# Altium footprint library ST封装.PcbLib: 1336 footprints (part 91 of 109) (continued)
## SQFP44X44-424(N) [mm] (continued)
Top Overlay:
  lines w0.2: -0.4,-42.65 -0.4,-44.1 1.05,-44.1 ; -0.4,0.65 -0.4,1.3 0.4,2.1 1.05,2.1 ; 44.35,-44.1 45.8,-44.1 45.8,-42.65 ; 44.35,2.1 45.8,2.1 45.8,0.65

## SQFP44X44-424(T) [mm]
pads (424):
  rect 0.3x1.6 smd: 1(0,0)
  oval 0.3x1.6 smd: 2(-0.4,0) 3(-0.8,0) 4(-1.2,0) 5(-1.6,0) 6(-2,0) 7(-2.4,0) 8(-2.8,0) 9(-3.2,0) 10(-3.6,0) 11(-4,0) 12(-4.4,0) 13(-4.8,0) 14(-5.2,0) 15(-5.6,0) 16(-6,0) 17(-6.4,0) 18(-6.8,0) 19(-7.2,0) 20(-7.6,0) 21(-8,0) 22(-8.4,0) 23(-8.8,0) 24(-9.2,0) 25(-9.6,0) 26(-10,0) 27(-10.4,0) 28(-10.8,0) 29(-11.2,0) 30(-11.6,0) 31(-12,0) 32(-12.4,0) 33(-12.8,0) 34(-13.2,0) 35(-13.6,0) 36(-14,0) 37(-14.4,0) 38(-14.8,0) 39(-15.2,0) 40(-15.6,0) 41(-16,0) 42(-16.4,0) 43(-16.8,0) 44(-17.2,0) 45(-17.6,0) 46(-18,0) 47(-18.4,0) 48(-18.8,0) 49(-19.2,0) 50(-19.6,0) 51(-20,0) 52(-20.4,0) 53(-20.8,0) 160(-20.8,-45.4) 161(-20.4,-45.4) 162(-20,-45.4) 163(-19.6,-45.4) 164(-19.2,-45.4) 165(-18.8,-45.4) 166(-18.4,-45.4) 167(-18,-45.4) 168(-17.6,-45.4) 169(-17.2,-45.4) 170(-16.8,-45.4) 171(-16.4,-45.4) 172(-16,-45.4) 173(-15.6,-45.4) 174(-15.2,-45.4) 175(-14.8,-45.4) 176(-14.4,-45.4) 177(-14,-45.4) 178(-13.6,-45.4) 179(-13.2,-45.4) 180(-12.8,-45.4) 181(-12.4,-45.4) 182(-12,-45.4) 183(-11.6,-45.4) 184(-11.2,-45.4) 185(-10.8,-45.4) 186(-10.4,-45.4) 187(-10,-45.4) 188(-9.6,-45.4) 189(-9.2,-45.4) 190(-8.8,-45.4) 191(-8.4,-45.4) 192(-8,-45.4) 193(-7.6,-45.4) 194(-7.2,-45.4) 195(-6.8,-45.4) 196(-6.4,-45.4) 197(-6,-45.4) 198(-5.6,-45.4) 199(-5.2,-45.4) 200(-4.8,-45.4) 201(-4.4,-45.4) 202(-4,-45.4) 203(-3.6,-45.4) 204(-3.2,-45.4) 205(-2.8,-45.4) 206(-2.4,-45.4) 207(-2,-45.4) 208(-1.6,-45.4) 209(-1.2,-45.4) 210(-0.8,-45.4) 211(-0.4,-45.4) 212(0,-45.4) 213(0.4,-45.4) 214(0.8,-45.4) 215(1.2,-45.4) 216(1.6,-45.4) 217(2,-45.4) 218(2.4,-45.4) 219(2.8,-45.4) 220(3.2,-45.4) 221(3.6,-45.4) 222(4,-45.4) 223(4.4,-45.4) 224(4.8,-45.4) 225(5.2,-45.4) 226(5.6,-45.4) 227(6,-45.4) 228(6.4,-45.4) 229(6.8,-45.4) 230(7.2,-45.4) 231(7.6,-45.4) 232(8,-45.4) 233(8.4,-45.4) 234(8.8,-45.4) 235(9.2,-45.4) 236(9.6,-45.4) 237(10,-45.4) 238(10.4,-45.4) 239(10.8,-45.4) 240(11.2,-45.4) 241(11.6,-45.4) 242(12,-45.4) 243(12.4,-45.4) 244(12.8,-45.4) 245(13.2,-45.4) 246(13.6,-45.4) 247(14,-45.4) 248(14.4,-45.4) 249(14.8,-45.4) 250(15.2,-45.4) 251(15.6,-45.4) 252(16,-45.4) 253(16.4,-45.4) 254(16.8,-45.4) 255(17.2,-45.4) 256(17.6,-45.4) 257(18,-45.4) 258(18.4,-45.4) 259(18.8,-45.4) 260(19.2,-45.4) 261(19.6,-45.4) 262(20,-45.4) 263(20.4,-45.4) 264(20.8,-45.4) 265(21.2,-45.4) 372(21.2,0) 373(20.8,0) 374(20.4,0) 375(20,0) 376(19.6,0) 377(19.2,0) 378(18.8,0) 379(18.4,0) 380(18,0) 381(17.6,0) 382(17.2,0) 383(16.8,0) 384(16.4,0) 385(16,0) 386(15.6,0) 387(15.2,0) 388(14.8,0) 389(14.4,0) 390(14,0) 391(13.6,0) 392(13.2,0) 393(12.8,0) 394(12.4,0) 395(12,0) 396(11.6,0) 397(11.2,0) 398(10.8,0) 399(10.4,0) 400(10,0) 401(9.6,0) 402(9.2,0) 403(8.8,0) 404(8.4,0) 405(8,0) 406(7.6,0) 407(7.2,0) 408(6.8,0) 409(6.4,0) 410(6,0) 411(5.6,0) 412(5.2,0) 413(4.8,0) 414(4.4,0) 415(4,0) 416(3.6,0) 417(3.2,0) 418(2.8,0) 419(2.4,0) 420(2,0) 421(1.6,0) 422(1.2,0) 423(0.8,0) 424(0.4,0)
  oval 1.6x0.3 smd: 54(-22.5,-1.7) 55(-22.5,-2.1) 56(-22.5,-2.5) 57(-22.5,-2.9) 58(-22.5,-3.3) 59(-22.5,-3.7) 60(-22.5,-4.1) 61(-22.5,-4.5) 62(-22.5,-4.9) 63(-22.5,-5.3) 64(-22.5,-5.7) 65(-22.5,-6.1) 66(-22.5,-6.5) 67(-22.5,-6.9) 68(-22.5,-7.3) 69(-22.5,-7.7) 70(-22.5,-8.1) 71(-22.5,-8.5) 72(-22.5,-8.9) 73(-22.5,-9.3) 74(-22.5,-9.7) 75(-22.5,-10.1) 76(-22.5,-10.5) 77(-22.5,-10.9) 78(-22.5,-11.3) 79(-22.5,-11.7) 80(-22.5,-12.1) 81(-22.5,-12.5) 82(-22.5,-12.9) 83(-22.5,-13.3) 84(-22.5,-13.7) 85(-22.5,-14.1) 86(-22.5,-14.5) 87(-22.5,-14.9) 88(-22.5,-15.3) 89(-22.5,-15.7) 90(-22.5,-16.1) 91(-22.5,-16.5) 92(-22.5,-16.9) 93(-22.5,-17.3) 94(-22.5,-17.7) 95(-22.5,-18.1) 96(-22.5,-18.5) 97(-22.5,-18.9) 98(-22.5,-19.3) 99(-22.5,-19.7) 100(-22.5,-20.1) 101(-22.5,-20.5) 102(-22.5,-20.9) 103(-22.5,-21.3) 104(-22.5,-21.7) 105(-22.5,-22.1) 106(-22.5,-22.5) 107(-22.5,-22.9) 108(-22.5,-23.3) 109(-22.5,-23.7) 110(-22.5,-24.1) 111(-22.5,-24.5) 112(-22.5,-24.9) 113(-22.5,-25.3) 114(-22.5,-25.7) 115(-22.5,-26.1) 116(-22.5,-26.5) 117(-22.5,-26.9) 118(-22.5,-27.3) 119(-22.5,-27.7) 120(-22.5,-28.1) 121(-22.5,-28.5) 122(-22.5,-28.9) 123(-22.5,-29.3) 124(-22.5,-29.7) 125(-22.5,-30.1) 126(-22.5,-30.5) 127(-22.5,-30.9) 128(-22.5,-31.3) 129(-22.5,-31.7) 130(-22.5,-32.1) 131(-22.5,-32.5) 132(-22.5,-32.9) 133(-22.5,-33.3) 134(-22.5,-33.7) 135(-22.5,-34.1) 136(-22.5,-34.5) 137(-22.5,-34.9) 138(-22.5,-35.3) 139(-22.5,-35.7) 140(-22.5,-36.1) 141(-22.5,-36.5) 142(-22.5,-36.9) 143(-22.5,-37.3) 144(-22.5,-37.7) 145(-22.5,-38.1) 146(-22.5,-38.5) 147(-22.5,-38.9) 148(-22.5,-39.3) 149(-22.5,-39.7) 150(-22.5,-40.1) 151(-22.5,-40.5) 152(-22.5,-40.9) 153(-22.5,-41.3) 154(-22.5,-41.7) 155(-22.5,-42.1) 156(-22.5,-42.5) 157(-22.5,-42.9) 158(-22.5,-43.3) 159(-22.5,-43.7) 266(22.9,-43.7) 267(22.9,-43.3) 268(22.9,-42.9) 269(22.9,-42.5) 270(22.9,-42.1) 271(22.9,-41.7) 272(22.9,-41.3) 273(22.9,-40.9) 274(22.9,-40.5) 275(22.9,-40.1) 276(22.9,-39.7) 277(22.9,-39.3) 278(22.9,-38.9) 279(22.9,-38.5) 280(22.9,-38.1) 281(22.9,-37.7) 282(22.9,-37.3) 283(22.9,-36.9) 284(22.9,-36.5) 285(22.9,-36.1) 286(22.9,-35.7) 287(22.9,-35.3) 288(22.9,-34.9) 289(22.9,-34.5) 290(22.9,-34.1) 291(22.9,-33.7) 292(22.9,-33.3) 293(22.9,-32.9) 294(22.9,-32.5) 295(22.9,-32.1) 296(22.9,-31.7) 297(22.9,-31.3) 298(22.9,-30.9) 299(22.9,-30.5) 300(22.9,-30.1) 301(22.9,-29.7) 302(22.9,-29.3) 303(22.9,-28.9) 304(22.9,-28.5) 305(22.9,-28.1) 306(22.9,-27.7) 307(22.9,-27.3) 308(22.9,-26.9) 309(22.9,-26.5) 310(22.9,-26.1) 311(22.9,-25.7) 312(22.9,-25.3) 313(22.9,-24.9) 314(22.9,-24.5) 315(22.9,-24.1) 316(22.9,-23.7) 317(22.9,-23.3) 318(22.9,-22.9) 319(22.9,-22.5) 320(22.9,-22.1) 321(22.9,-21.7) 322(22.9,-21.3) 323(22.9,-20.9) 324(22.9,-20.5) 325(22.9,-20.1) 326(22.9,-19.7) 327(22.9,-19.3) 328(22.9,-18.9) 329(22.9,-18.5) 330(22.9,-18.1) 331(22.9,-17.7) 332(22.9,-17.3) 333(22.9,-16.9) 334(22.9,-16.5) 335(22.9,-16.1) 336(22.9,-15.7) 337(22.9,-15.3) 338(22.9,-14.9) 339(22.9,-14.5) 340(22.9,-14.1) 341(22.9,-13.7) 342(22.9,-13.3) 343(22.9,-12.9) 344(22.9,-12.5) 345(22.9,-12.1) 346(22.9,-11.7) 347(22.9,-11.3) 348(22.9,-10.9) 349(22.9,-10.5) 350(22.9,-10.1) 351(22.9,-9.7) 352(22.9,-9.3) 353(22.9,-8.9) 354(22.9,-8.5) 355(22.9,-8.1) 356(22.9,-7.7) 357(22.9,-7.3) 358(22.9,-6.9) 359(22.9,-6.5) 360(22.9,-6.1) 361(22.9,-5.7) 362(22.9,-5.3) 363(22.9,-4.9) 364(22.9,-4.5) 365(22.9,-4.1) 366(22.9,-3.7) 367(22.9,-3.3) 368(22.9,-2.9) 369(22.9,-2.5) 370(22.9,-2.1) 371(22.9,-1.7)
Top Overlay:
  lines w0.2: -22.9,-44.35 -22.9,-45.8 -21.45,-45.8 ; -22.9,-1.05 -22.9,-0.4 -22.1,0.4 -21.45,0.4 ; 21.85,-45.8 23.3,-45.8 23.3,-44.35 ; 21.85,0.4 23.3,0.4 23.3,-1.05

## SQFP44X44-432(N) [mm]
pads (432):
  rect 1.6x0.3 smd: 1(0,0)
  oval 1.6x0.3 smd: 2(0,-0.4) 3(0,-0.8) 4(0,-1.2) 5(0,-1.6) 6(0,-2) 7(0,-2.4) 8(0,-2.8) 9(0,-3.2) 10(0,-3.6) 11(0,-4) 12(0,-4.4) 13(0,-4.8) 14(0,-5.2) 15(0,-5.6) 16(0,-6) 17(0,-6.4) 18(0,-6.8) 19(0,-7.2) 20(0,-7.6) 21(0,-8) 22(0,-8.4) 23(0,-8.8) 24(0,-9.2) 25(0,-9.6) 26(0,-10) 27(0,-10.4) 28(0,-10.8) 29(0,-11.2) 30(0,-11.6) 31(0,-12) 32(0,-12.4) 33(0,-12.8) 34(0,-13.2) 35(0,-13.6) 36(0,-14) 37(0,-14.4) 38(0,-14.8) 39(0,-15.2) 40(0,-15.6) 41(0,-16) 42(0,-16.4) 43(0,-16.8) 44(0,-17.2) 45(0,-17.6) 46(0,-18) 47(0,-18.4) 48(0,-18.8) 49(0,-19.2) 50(0,-19.6) 51(0,-20) 52(0,-20.4) 53(0,-20.8) 54(0,-21.2) 55(0,-21.6) 56(0,-22) 57(0,-22.4) 58(0,-22.8) 59(0,-23.2) 60(0,-23.6) 61(0,-24) 62(0,-24.4) 63(0,-24.8) 64(0,-25.2) 65(0,-25.6) 66(0,-26) 67(0,-26.4) 68(0,-26.8) 69(0,-27.2) 70(0,-27.6) 71(0,-28) 72(0,-28.4) 73(0,-28.8) 74(0,-29.2) 75(0,-29.6) 76(0,-30) 77(0,-30.4) 78(0,-30.8) 79(0,-31.2) 80(0,-31.6) 81(0,-32) 82(0,-32.4) 83(0,-32.8) 84(0,-33.2) 85(0,-33.6) 86(0,-34) 87(0,-34.4) 88(0,-34.8) 89(0,-35.2) 90(0,-35.6) 91(0,-36) 92(0,-36.4) 93(0,-36.8) 94(0,-37.2) 95(0,-37.6) 96(0,-38) 97(0,-38.4) 98(0,-38.8) 99(0,-39.2) 100(0,-39.6) 101(0,-40) 102(0,-40.4) 103(0,-40.8) 104(0,-41.2) 105(0,-41.6) 106(0,-42) 107(0,-42.4) 108(0,-42.8) 217(45.4,-42.8) 218(45.4,-42.4) 219(45.4,-42) 220(45.4,-41.6) 221(45.4,-41.2) 222(45.4,-40.8) 223(45.4,-40.4) 224(45.4,-40) 225(45.4,-39.6) 226(45.4,-39.2) 227(45.4,-38.8) 228(45.4,-38.4) 229(45.4,-38) 230(45.4,-37.6) 231(45.4,-37.2) 232(45.4,-36.8) 233(45.4,-36.4) 234(45.4,-36) 235(45.4,-35.6) 236(45.4,-35.2) 237(45.4,-34.8) 238(45.4,-34.4) 239(45.4,-34) 240(45.4,-33.6) 241(45.4,-33.2) 242(45.4,-32.8) 243(45.4,-32.4) 244(45.4,-32) 245(45.4,-31.6) 246(45.4,-31.2) 247(45.4,-30.8) 248(45.4,-30.4) 249(45.4,-30) 250(45.4,-29.6) 251(45.4,-29.2) 252(45.4,-28.8) 253(45.4,-28.4) 254(45.4,-28) 255(45.4,-27.6) 256(45.4,-27.2) 257(45.4,-26.8) 258(45.4,-26.4) 259(45.4,-26) 260(45.4,-25.6) 261(45.4,-25.2) 262(45.4,-24.8) 263(45.4,-24.4) 264(45.4,-24) 265(45.4,-23.6) 266(45.4,-23.2) 267(45.4,-22.8) 268(45.4,-22.4) 269(45.4,-22) 270(45.4,-21.6) 271(45.4,-21.2) 272(45.4,-20.8) 273(45.4,-20.4) 274(45.4,-20) 275(45.4,-19.6) 276(45.4,-19.2) 277(45.4,-18.8) 278(45.4,-18.4) 279(45.4,-18) 280(45.4,-17.6) 281(45.4,-17.2) 282(45.4,-16.8) 283(45.4,-16.4) 284(45.4,-16) 285(45.4,-15.6) 286(45.4,-15.2) 287(45.4,-14.8) 288(45.4,-14.4) 289(45.4,-14) 290(45.4,-13.6) 291(45.4,-13.2) 292(45.4,-12.8) 293(45.4,-12.4) 294(45.4,-12) 295(45.4,-11.6) 296(45.4,-11.2) 297(45.4,-10.8) 298(45.4,-10.4) 299(45.4,-10) 300(45.4,-9.6) 301(45.4,-9.2) 302(45.4,-8.8) 303(45.4,-8.4) 304(45.4,-8) 305(45.4,-7.6) 306(45.4,-7.2) 307(45.4,-6.8) 308(45.4,-6.4) 309(45.4,-6) 310(45.4,-5.6) 311(45.4,-5.2) 312(45.4,-4.8) 313(45.4,-4.4) 314(45.4,-4) 315(45.4,-3.6) 316(45.4,-3.2) 317(45.4,-2.8) 318(45.4,-2.4) 319(45.4,-2) 320(45.4,-1.6) 321(45.4,-1.2) 322(45.4,-0.8) 323(45.4,-0.4) 324(45.4,0)
  oval 0.3x1.6 smd: 109(1.3,-44.1) 110(1.7,-44.1) 111(2.1,-44.1) 112(2.5,-44.1) 113(2.9,-44.1) 114(3.3,-44.1) 115(3.7,-44.1) 116(4.1,-44.1) 117(4.5,-44.1) 118(4.9,-44.1) 119(5.3,-44.1) 120(5.7,-44.1) 121(6.1,-44.1) 122(6.5,-44.1) 123(6.9,-44.1) 124(7.3,-44.1) 125(7.7,-44.1) 126(8.1,-44.1) 127(8.5,-44.1) 128(8.9,-44.1) 129(9.3,-44.1) 130(9.7,-44.1) 131(10.1,-44.1) 132(10.5,-44.1) 133(10.9,-44.1) 134(11.3,-44.1) 135(11.7,-44.1) 136(12.1,-44.1) 137(12.5,-44.1) 138(12.9,-44.1) 139(13.3,-44.1) 140(13.7,-44.1) 141(14.1,-44.1) 142(14.5,-44.1) 143(14.9,-44.1) 144(15.3,-44.1) 145(15.7,-44.1) 146(16.1,-44.1) 147(16.5,-44.1) 148(16.9,-44.1) 149(17.3,-44.1) 150(17.7,-44.1) 151(18.1,-44.1) 152(18.5,-44.1) 153(18.9,-44.1) 154(19.3,-44.1) 155(19.7,-44.1) 156(20.1,-44.1) 157(20.5,-44.1) 158(20.9,-44.1) 159(21.3,-44.1) 160(21.7,-44.1) 161(22.1,-44.1) 162(22.5,-44.1) 163(22.9,-44.1) 164(23.3,-44.1) 165(23.7,-44.1) 166(24.1,-44.1) 167(24.5,-44.1) 168(24.9,-44.1) 169(25.3,-44.1) 170(25.7,-44.1) 171(26.1,-44.1) 172(26.5,-44.1) 173(26.9,-44.1) 174(27.3,-44.1) 175(27.7,-44.1) 176(28.1,-44.1) 177(28.5,-44.1) 178(28.9,-44.1) 179(29.3,-44.1) 180(29.7,-44.1) 181(30.1,-44.1) 182(30.5,-44.1) 183(30.9,-44.1) 184(31.3,-44.1) 185(31.7,-44.1) 186(32.1,-44.1) 187(32.5,-44.1) 188(32.9,-44.1) 189(33.3,-44.1) 190(33.7,-44.1) 191(34.1,-44.1) 192(34.5,-44.1) 193(34.9,-44.1) 194(35.3,-44.1) 195(35.7,-44.1) 196(36.1,-44.1) 197(36.5,-44.1) 198(36.9,-44.1) 199(37.3,-44.1) 200(37.7,-44.1) 201(38.1,-44.1) 202(38.5,-44.1) 203(38.9,-44.1) 204(39.3,-44.1) 205(39.7,-44.1) 206(40.1,-44.1) 207(40.5,-44.1) 208(40.9,-44.1) 209(41.3,-44.1) 210(41.7,-44.1) 211(42.1,-44.1) 212(42.5,-44.1) 213(42.9,-44.1) 214(43.3,-44.1) 215(43.7,-44.1) 216(44.1,-44.1) 325(44.1,1.3) 326(43.7,1.3) 327(43.3,1.3) 328(42.9,1.3) 329(42.5,1.3) 330(42.1,1.3) 331(41.7,1.3) 332(41.3,1.3) 333(40.9,1.3) 334(40.5,1.3) 335(40.1,1.3) 336(39.7,1.3) 337(39.3,1.3) 338(38.9,1.3) 339(38.5,1.3) 340(38.1,1.3) 341(37.7,1.3) 342(37.3,1.3) 343(36.9,1.3) 344(36.5,1.3) 345(36.1,1.3) 346(35.7,1.3) 347(35.3,1.3) 348(34.9,1.3) 349(34.5,1.3) 350(34.1,1.3) 351(33.7,1.3) 352(33.3,1.3) 353(32.9,1.3) 354(32.5,1.3) 355(32.1,1.3) 356(31.7,1.3) 357(31.3,1.3) 358(30.9,1.3) 359(30.5,1.3) 360(30.1,1.3) 361(29.7,1.3) 362(29.3,1.3) 363(28.9,1.3) 364(28.5,1.3) 365(28.1,1.3) 366(27.7,1.3) 367(27.3,1.3) 368(26.9,1.3) 369(26.5,1.3) 370(26.1,1.3) 371(25.7,1.3) 372(25.3,1.3) 373(24.9,1.3) 374(24.5,1.3) 375(24.1,1.3) 376(23.7,1.3) 377(23.3,1.3) 378(22.9,1.3) 379(22.5,1.3) 380(22.1,1.3) 381(21.7,1.3) 382(21.3,1.3) 383(20.9,1.3) 384(20.5,1.3) 385(20.1,1.3) 386(19.7,1.3) 387(19.3,1.3) 388(18.9,1.3) 389(18.5,1.3) 390(18.1,1.3) 391(17.7,1.3) 392(17.3,1.3) 393(16.9,1.3) 394(16.5,1.3) 395(16.1,1.3) 396(15.7,1.3) 397(15.3,1.3) 398(14.9,1.3) 399(14.5,1.3) 400(14.1,1.3) 401(13.7,1.3) 402(13.3,1.3) 403(12.9,1.3) 404(12.5,1.3) 405(12.1,1.3) 406(11.7,1.3) 407(11.3,1.3) 408(10.9,1.3) 409(10.5,1.3) 410(10.1,1.3) 411(9.7,1.3) 412(9.3,1.3) 413(8.9,1.3) 414(8.5,1.3) 415(8.1,1.3) 416(7.7,1.3) 417(7.3,1.3) 418(6.9,1.3) 419(6.5,1.3) 420(6.1,1.3) 421(5.7,1.3) 422(5.3,1.3) 423(4.9,1.3) 424(4.5,1.3) 425(4.1,1.3) 426(3.7,1.3) 427(3.3,1.3) 428(2.9,1.3) 429(2.5,1.3) 430(2.1,1.3) 431(1.7,1.3) 432(1.3,1.3)
Top Overlay:
  lines w0.2: -0.4,-43.45 -0.4,-44.5 0.65,-44.5 ; -0.4,0.65 -0.4,0.9 0.4,1.7 0.65,1.7 ; 44.75,-44.5 45.8,-44.5 45.8,-43.45 ; 44.75,1.7 45.8,1.7 45.8,0.65

## SQFP44X44-432(T) [mm]
pads (432):
  rect 0.3x1.6 smd: 1(0,0)
  oval 0.3x1.6 smd: 2(-0.4,0) 3(-0.8,0) 4(-1.2,0) 5(-1.6,0) 6(-2,0) 7(-2.4,0) 8(-2.8,0) 9(-3.2,0) 10(-3.6,0) 11(-4,0) 12(-4.4,0) 13(-4.8,0) 14(-5.2,0) 15(-5.6,0) 16(-6,0) 17(-6.4,0) 18(-6.8,0) 19(-7.2,0) 20(-7.6,0) 21(-8,0) 22(-8.4,0) 23(-8.8,0) 24(-9.2,0) 25(-9.6,0) 26(-10,0) 27(-10.4,0) 28(-10.8,0) 29(-11.2,0) 30(-11.6,0) 31(-12,0) 32(-12.4,0) 33(-12.8,0) 34(-13.2,0) 35(-13.6,0) 36(-14,0) 37(-14.4,0) 38(-14.8,0) 39(-15.2,0) 40(-15.6,0) 41(-16,0) 42(-16.4,0) 43(-16.8,0) 44(-17.2,0) 45(-17.6,0) 46(-18,0) 47(-18.4,0) 48(-18.8,0) 49(-19.2,0) 50(-19.6,0) 51(-20,0) 52(-20.4,0) 53(-20.8,0) 54(-21.2,0) 163(-21.2,-45.4) 164(-20.8,-45.4) 165(-20.4,-45.4) 166(-20,-45.4) 167(-19.6,-45.4) 168(-19.2,-45.4) 169(-18.8,-45.4) 170(-18.4,-45.4) 171(-18,-45.4) 172(-17.6,-45.4) 173(-17.2,-45.4) 174(-16.8,-45.4) 175(-16.4,-45.4) 176(-16,-45.4) 177(-15.6,-45.4) 178(-15.2,-45.4) 179(-14.8,-45.4) 180(-14.4,-45.4) 181(-14,-45.4) 182(-13.6,-45.4) 183(-13.2,-45.4) 184(-12.8,-45.4) 185(-12.4,-45.4) 186(-12,-45.4) 187(-11.6,-45.4) 188(-11.2,-45.4) 189(-10.8,-45.4) 190(-10.4,-45.4) 191(-10,-45.4) 192(-9.6,-45.4) 193(-9.2,-45.4) 194(-8.8,-45.4) 195(-8.4,-45.4) 196(-8,-45.4) 197(-7.6,-45.4) 198(-7.2,-45.4) 199(-6.8,-45.4) 200(-6.4,-45.4) 201(-6,-45.4) 202(-5.6,-45.4) 203(-5.2,-45.4) 204(-4.8,-45.4) 205(-4.4,-45.4) 206(-4,-45.4) 207(-3.6,-45.4) 208(-3.2,-45.4) 209(-2.8,-45.4) 210(-2.4,-45.4) 211(-2,-45.4) 212(-1.6,-45.4) 213(-1.2,-45.4) 214(-0.8,-45.4) 215(-0.4,-45.4) 216(0,-45.4) 217(0.4,-45.4) 218(0.8,-45.4) 219(1.2,-45.4) 220(1.6,-45.4) 221(2,-45.4) 222(2.4,-45.4) 223(2.8,-45.4) 224(3.2,-45.4) 225(3.6,-45.4) 226(4,-45.4) 227(4.4,-45.4) 228(4.8,-45.4) 229(5.2,-45.4) 230(5.6,-45.4) 231(6,-45.4) 232(6.4,-45.4) 233(6.8,-45.4) 234(7.2,-45.4) 235(7.6,-45.4) 236(8,-45.4) 237(8.4,-45.4) 238(8.8,-45.4) 239(9.2,-45.4) 240(9.6,-45.4) 241(10,-45.4) 242(10.4,-45.4) 243(10.8,-45.4) 244(11.2,-45.4) 245(11.6,-45.4) 246(12,-45.4) 247(12.4,-45.4) 248(12.8,-45.4) 249(13.2,-45.4) 250(13.6,-45.4) 251(14,-45.4) 252(14.4,-45.4) 253(14.8,-45.4) 254(15.2,-45.4) 255(15.6,-45.4) 256(16,-45.4) 257(16.4,-45.4) 258(16.8,-45.4) 259(17.2,-45.4) 260(17.6,-45.4) 261(18,-45.4) 262(18.4,-45.4) 263(18.8,-45.4) 264(19.2,-45.4) 265(19.6,-45.4) 266(20,-45.4) 267(20.4,-45.4) 268(20.8,-45.4) 269(21.2,-45.4) 270(21.6,-45.4) 379(21.6,0) 380(21.2,0) 381(20.8,0) 382(20.4,0) 383(20,0) 384(19.6,0) 385(19.2,0) 386(18.8,0) 387(18.4,0) 388(18,0) 389(17.6,0) 390(17.2,0) 391(16.8,0) 392(16.4,0) 393(16,0) 394(15.6,0) 395(15.2,0) 396(14.8,0) 397(14.4,0) 398(14,0) 399(13.6,0) 400(13.2,0) 401(12.8,0) 402(12.4,0) 403(12,0) 404(11.6,0) 405(11.2,0) 406(10.8,0) 407(10.4,0) 408(10,0) 409(9.6,0) 410(9.2,0) 411(8.8,0) 412(8.4,0) 413(8,0) 414(7.6,0) 415(7.2,0) 416(6.8,0) 417(6.4,0) 418(6,0) 419(5.6,0) 420(5.2,0) 421(4.8,0) 422(4.4,0) 423(4,0) 424(3.6,0) 425(3.2,0) 426(2.8,0) 427(2.4,0) 428(2,0) 429(1.6,0) 430(1.2,0) 431(0.8,0) 432(0.4,0)
  oval 1.6x0.3 smd: 55(-22.5,-1.3) 56(-22.5,-1.7) 57(-22.5,-2.1) 58(-22.5,-2.5) 59(-22.5,-2.9) 60(-22.5,-3.3) 61(-22.5,-3.7) 62(-22.5,-4.1) 63(-22.5,-4.5) 64(-22.5,-4.9) 65(-22.5,-5.3) 66(-22.5,-5.7) 67(-22.5,-6.1) 68(-22.5,-6.5) 69(-22.5,-6.9) 70(-22.5,-7.3) 71(-22.5,-7.7) 72(-22.5,-8.1) 73(-22.5,-8.5) 74(-22.5,-8.9) 75(-22.5,-9.3) 76(-22.5,-9.7) 77(-22.5,-10.1) 78(-22.5,-10.5) 79(-22.5,-10.9) 80(-22.5,-11.3) 81(-22.5,-11.7) 82(-22.5,-12.1) 83(-22.5,-12.5) 84(-22.5,-12.9) 85(-22.5,-13.3) 86(-22.5,-13.7) 87(-22.5,-14.1) 88(-22.5,-14.5) 89(-22.5,-14.9) 90(-22.5,-15.3) 91(-22.5,-15.7) 92(-22.5,-16.1) 93(-22.5,-16.5) 94(-22.5,-16.9) 95(-22.5,-17.3) 96(-22.5,-17.7) 97(-22.5,-18.1) 98(-22.5,-18.5) 99(-22.5,-18.9) 100(-22.5,-19.3) 101(-22.5,-19.7) 102(-22.5,-20.1) 103(-22.5,-20.5) 104(-22.5,-20.9) 105(-22.5,-21.3) 106(-22.5,-21.7) 107(-22.5,-22.1) 108(-22.5,-22.5) 109(-22.5,-22.9) 110(-22.5,-23.3) 111(-22.5,-23.7) 112(-22.5,-24.1) 113(-22.5,-24.5) 114(-22.5,-24.9) 115(-22.5,-25.3) 116(-22.5,-25.7) 117(-22.5,-26.1) 118(-22.5,-26.5) 119(-22.5,-26.9) 120(-22.5,-27.3) 121(-22.5,-27.7) 122(-22.5,-28.1) 123(-22.5,-28.5) 124(-22.5,-28.9) 125(-22.5,-29.3) 126(-22.5,-29.7) 127(-22.5,-30.1) 128(-22.5,-30.5) 129(-22.5,-30.9) 130(-22.5,-31.3) 131(-22.5,-31.7) 132(-22.5,-32.1) 133(-22.5,-32.5) 134(-22.5,-32.9) 135(-22.5,-33.3) 136(-22.5,-33.7) 137(-22.5,-34.1) 138(-22.5,-34.5) 139(-22.5,-34.9) 140(-22.5,-35.3) 141(-22.5,-35.7) 142(-22.5,-36.1) 143(-22.5,-36.5) 144(-22.5,-36.9) 145(-22.5,-37.3) 146(-22.5,-37.7) 147(-22.5,-38.1) 148(-22.5,-38.5) 149(-22.5,-38.9) 150(-22.5,-39.3) 151(-22.5,-39.7) 152(-22.5,-40.1) 153(-22.5,-40.5) 154(-22.5,-40.9) 155(-22.5,-41.3) 156(-22.5,-41.7) 157(-22.5,-42.1) 158(-22.5,-42.5) 159(-22.5,-42.9) 160(-22.5,-43.3) 161(-22.5,-43.7) 162(-22.5,-44.1) 271(22.9,-44.1) 272(22.9,-43.7) 273(22.9,-43.3) 274(22.9,-42.9) 275(22.9,-42.5) 276(22.9,-42.1) 277(22.9,-41.7) 278(22.9,-41.3) 279(22.9,-40.9) 280(22.9,-40.5) 281(22.9,-40.1) 282(22.9,-39.7) 283(22.9,-39.3) 284(22.9,-38.9) 285(22.9,-38.5) 286(22.9,-38.1) 287(22.9,-37.7) 288(22.9,-37.3) 289(22.9,-36.9) 290(22.9,-36.5) 291(22.9,-36.1) 292(22.9,-35.7) 293(22.9,-35.3) 294(22.9,-34.9) 295(22.9,-34.5) 296(22.9,-34.1) 297(22.9,-33.7) 298(22.9,-33.3) 299(22.9,-32.9) 300(22.9,-32.5) 301(22.9,-32.1) 302(22.9,-31.7) 303(22.9,-31.3) 304(22.9,-30.9) 305(22.9,-30.5) 306(22.9,-30.1) 307(22.9,-29.7) 308(22.9,-29.3) 309(22.9,-28.9) 310(22.9,-28.5) 311(22.9,-28.1) 312(22.9,-27.7) 313(22.9,-27.3) 314(22.9,-26.9) 315(22.9,-26.5) 316(22.9,-26.1) 317(22.9,-25.7) 318(22.9,-25.3) 319(22.9,-24.9) 320(22.9,-24.5) 321(22.9,-24.1) 322(22.9,-23.7) 323(22.9,-23.3) 324(22.9,-22.9) 325(22.9,-22.5) 326(22.9,-22.1) 327(22.9,-21.7) 328(22.9,-21.3) 329(22.9,-20.9) 330(22.9,-20.5) 331(22.9,-20.1) 332(22.9,-19.7) 333(22.9,-19.3) 334(22.9,-18.9) 335(22.9,-18.5) 336(22.9,-18.1) 337(22.9,-17.7) 338(22.9,-17.3) 339(22.9,-16.9) 340(22.9,-16.5) 341(22.9,-16.1) 342(22.9,-15.7) 343(22.9,-15.3) 344(22.9,-14.9) 345(22.9,-14.5) 346(22.9,-14.1) 347(22.9,-13.7) 348(22.9,-13.3) 349(22.9,-12.9) 350(22.9,-12.5) 351(22.9,-12.1) 352(22.9,-11.7) 353(22.9,-11.3) 354(22.9,-10.9) 355(22.9,-10.5) 356(22.9,-10.1) 357(22.9,-9.7) 358(22.9,-9.3) 359(22.9,-8.9) 360(22.9,-8.5) 361(22.9,-8.1) 362(22.9,-7.7) 363(22.9,-7.3) 364(22.9,-6.9) 365(22.9,-6.5) 366(22.9,-6.1) 367(22.9,-5.7) 368(22.9,-5.3) 369(22.9,-4.9) 370(22.9,-4.5) 371(22.9,-4.1) 372(22.9,-3.7) 373(22.9,-3.3) 374(22.9,-2.9) 375(22.9,-2.5) 376(22.9,-2.1) 377(22.9,-1.7) 378(22.9,-1.3)
Top Overlay:
  lines w0.2: -22.9,-44.75 -22.9,-45.8 -21.85,-45.8 ; -22.9,-0.65 -22.9,-0.4 -22.1,0.4 -21.85,0.4 ; 22.25,-45.8 23.3,-45.8 23.3,-44.75 ; 22.25,0.4 23.3,0.4 23.3,-0.65